# Altium footprint library Footprint.PcbLib: 14 footprints
Each footprint in its own frame and in the unit in brackets; x right, y up, seen from the top. Pads: shape width x height; smd on the part's side, far side on the other; paste and mask are expansions set on the pad; w line width, h text height; cw(c..) or ccw(c..) is an arc to the next point about the centre after c.
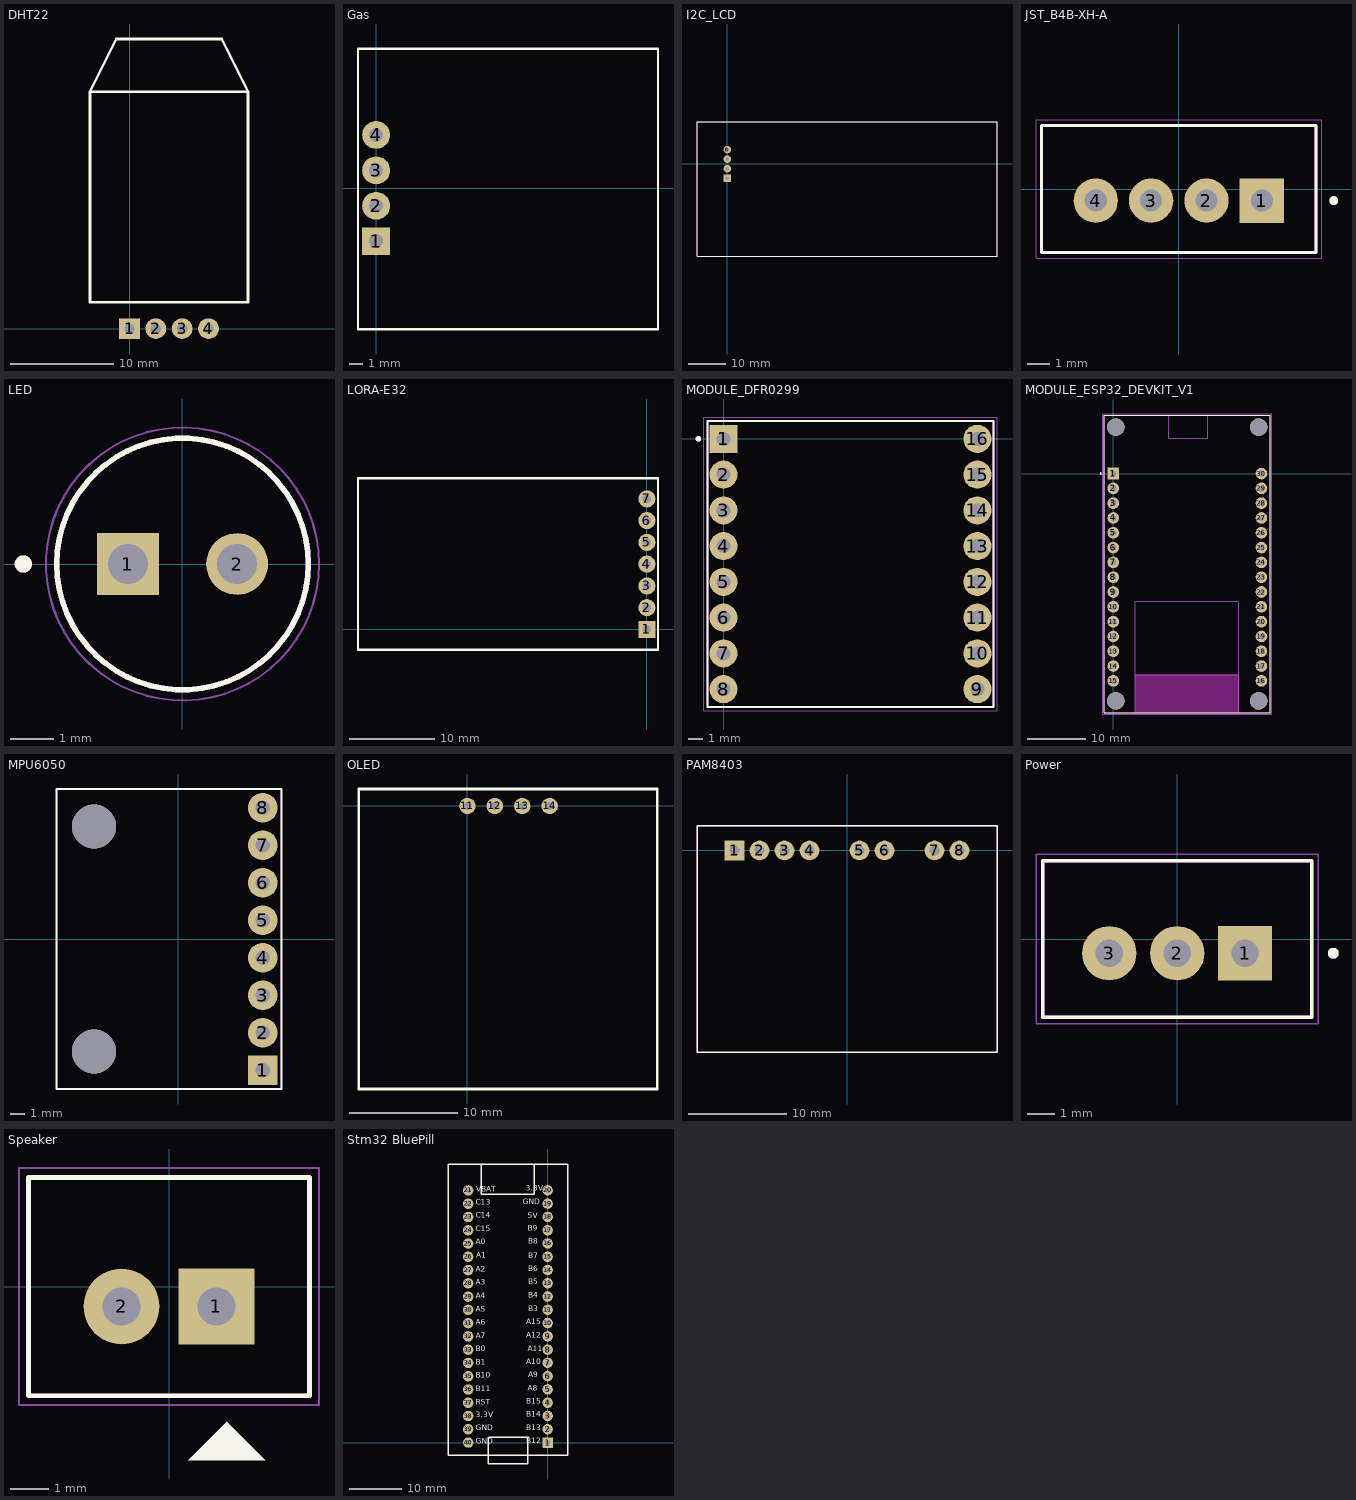
[diagram p0: the footprints below, top view; thin cyan lines are the x and y axes]

## DHT22 [mm]
pads (4):
  rect 2x2 hole 1: 1(0,0)
  round 2 hole 1: 2(2.54,0) 3(5.08,0) 4(7.62,0)
Top Overlay:
  lines w0.254: -3.81,22.86 -3.81,2.54 3.81,2.54 11.43,2.54 11.43,22.86 ; -3.81,22.86 11.43,22.86 ; -3.81,22.86 -1.27,27.94 8.89,27.94 11.43,22.86
3D body "step_temp.STEP": height 7.7, standoff -4.5, extent -3.74,-0.25 11.36,27.64

## Gas [mm]
pads (4):
  rect 2x2 hole 1: 1(0,-3.81)
  round 2 hole 1: 2(0,-1.27) 3(0,1.27) 4(0,3.81)
Top Overlay:
  lines w0.15: -1.301,-10.118 -1.301,9.982 20.199,9.982 20.199,-10.118 -1.301,-10.118
Top Assembly:
  lines w0.1: -1.301,-10.118 -1.301,9.982 20.199,9.982 20.199,-10.118 -1.301,-10.118
3D body "User Library-MQ2 Gas Sensor.STEP": height 32.26, standoff -3.99, extent -1.301,-10.118 20.199,9.982

## I2C_LCD [mm]
pads (4):
  round 2 hole 1: 8(0,3.81) 15(0,-1.27) 16(0,1.27)
  rect 2x2 hole 1: 14(0,-3.81)
Top Overlay:
  lines w0.15: -8.088,-24.693 71.912,-24.693 71.912,11.307 -8.088,11.307 -8.088,-24.693
Top Assembly:
  lines w0.1: -8.088,-24.693 71.912,-24.693 71.912,11.307 -8.088,11.307 -8.088,-24.693
3D body "LCD AP214.STEP": height 22.01, standoff -0.61, extent -8.088,-24.693 71.912,11.307

## JST_B4B-XH-A [mm]
height 7
pads (4):
  rect 2x2 hole 1: 1(3.75,-0.525)
  round 2 hole 1: 2(1.25,-0.525) 3(-1.25,-0.525) 4(-3.75,-0.525)
Top Overlay:
  circle w0.2: c7,-0.525 r0.1
  lines w0.127: -6.2,-2.875 6.2,-2.875 6.2,2.875 -6.2,2.875 -6.2,-2.875
Top 3D Body:
  circle w0.2: c7,-0.525 r0.1
  lines w0.127: -6.2,-2.875 6.2,-2.875 6.2,2.875 -6.2,2.875 -6.2,-2.875
Top Assembly:
  lines w0.05: -6.45,-3.125 6.45,-3.125 6.45,3.125 -6.45,3.125 -6.45,-3.125
3D body "step_temp.STEP": height 7, standoff -3.4, extent -6.2,-2.875 6.2,2.875

## LED [mm]
pads (2):
  rect 1.438x1.438 / inner round 1.438 / far side rect 1.438x1.438 hole 0.93: 1(-1.27,0)
  round 1.438 hole 0.93: 2(1.27,0)
Top Overlay:
  circle w0.127: c0,0 r2.923
  circle w0.2: c-3.7,0 r0.1
Top 3D Body:
  circle w0.127: c0,0 r2.923
  circle w0.2: c-3.7,0 r0.1
Top Assembly:
  circle w0.05: c0,0 r3.173
3D body "step_temp.STEP": height 12.7, standoff -21.1, extent -2.9,-2.897 2.5,2.897

## LORA-E32 [mm] "Design By @Alixahedi"
pads (7):
  rect 2x2 hole 1: 1(0,0)
  round 2 hole 1: 2(0,2.54) 3(0,5.08) 4(0,7.62) 5(0,10.16) 6(0,12.7) 7(0,15.24)
Top Overlay:
  lines w0.254: -33.707,-2.362 1.293,-2.362 1.293,17.638 -33.707,17.638 -33.707,-2.362
3D body "E32-433T20DT.stp": height 8.1, standoff -5.52, extent -46.976,-2.88 1.524,18.12

## MODULE_DFR0299 [mm]
pads (16):
  rect 2x2 hole 1: 1(0,0)
  round 2 hole 1: 2(0,-2.54) 3(0,-5.08) 4(0,-7.62) 5(0,-10.16) 6(0,-12.7) 7(0,-15.24) 8(0,-17.78) 9(18.034,-17.78) 10(18.034,-15.24) 11(18.034,-12.7) 12(18.034,-10.16) 13(18.034,-7.62) 14(18.034,-5.08) 15(18.034,-2.54) 16(18.034,0)
Top Overlay:
  circle w0.2: c-1.783,0 r0.1
  lines w0.127: -1.143,-19.05 19.177,-19.05 19.177,1.27 -1.143,1.27 -1.143,-19.05
Top 3D Body:
  circle w0.2: c-1.783,0 r0.1
  lines w0.127: -1.143,-19.05 -1.143,1.27 19.177,1.27 19.177,-19.05 -1.143,-19.05
Top Assembly:
  lines w0.05: -1.393,-19.3 -1.393,1.52 19.427,1.52 19.427,-19.3 -1.393,-19.3
3D body "step_temp.STEP": height 6.25, standoff -5.5, extent -1.143,-19.05 19.177,1.27

## MODULE_ESP32_DEVKIT_V1 [mm]
height 6.8
pads (34):
  rect 2x2 / inner round 2 / far side rect 2x2 hole 1.02: 1(0,0)
  round 2 hole 1.02: 2(0,-2.54) 3(0,-5.08) 4(0,-7.62) 5(0,-10.16) 6(0,-12.7) 7(0,-15.24) 8(0,-17.78) 9(0,-20.32) 10(0,-22.86) 11(0,-25.4) 12(0,-27.94) 13(0,-30.48) 14(0,-33.02) 15(0,-35.56) 16(25.4,-35.56) 17(25.4,-33.02) 18(25.4,-30.48) 19(25.4,-27.94) 20(25.4,-25.4) 21(25.4,-22.86) 22(25.4,-20.32) 23(25.4,-17.78) 24(25.4,-15.24) 25(25.4,-12.7) 26(25.4,-10.16) 27(25.4,-7.62) 28(25.4,-5.08) 29(25.4,-2.54) 30(25.4,0)
  round 3 hole 3 unplated: ""(0.42,-38.99) ""(0.42,7.96) ""(24.93,-38.99) ""(24.93,7.96)
Top Overlay:
  circle w0.2: c-2.15,0 r0.1
  lines w0.127: -1.58,-40.99 3.79,-40.99 21.48,-40.99 26.93,-40.99 ; -1.58,-40.99 -1.58,9.96 ; -1.58,-40.99 -1.58,9.96 ; -1.58,-40.99 26.93,-40.99 ; -1.58,9.96 9.489,9.96 16.2,9.96 26.93,9.96 ; -1.58,9.96 26.93,9.96 ; 26.93,-40.99 26.93,9.96 ; 26.93,-40.99 26.93,9.96
Keep-Out Layer:
  region: 21.48,-40.99 3.79,-40.99 3.79,-34.5 21.48,-34.5
  region: 21.48,-40.99 3.79,-40.99 3.79,-34.5 21.48,-34.5
Top 3D Body:
  circle w0.2: c-2.15,0 r0.1
  lines w0.127: 3.79,-40.99 3.79,-34.5 ; 3.79,-40.99 21.48,-40.99 ; 3.79,-40.99 -1.58,-40.99 -1.58,9.96 9.489,9.96 ; 3.79,-34.5 21.48,-34.5 ; 3.79,-34.5 3.79,-21.87 21.48,-21.87 21.48,-34.5 ; 9.489,9.96 9.489,6.07 16.2,6.07 16.2,9.96 ; 9.489,9.96 16.2,9.96 ; 16.2,9.96 26.93,9.96 26.93,-40.99 21.48,-40.99 ; 21.48,-40.99 21.48,-34.5
Top Assembly:
  lines w0.05: -1.83,-41.24 27.18,-41.24 27.18,10.21 -1.83,10.21 -1.83,-41.24
3D body "step_temp.STEP": height 7.05, standoff -6, extent -1.4,-41.618 26.8,10.832

## MPU6050 [mm]
pads (10):
  rect 2x2 hole 1: 1(5.715,-8.89)
  round 2 hole 1: 2(5.715,-6.35) 3(5.715,-3.81) 4(5.715,-1.27) 5(5.715,1.27) 6(5.715,3.81) 7(5.715,6.35) 8(5.715,8.89)
  round 2.997 hole 2.997: ""(-5.715,-7.62) ""(-5.715,7.62)
Top Overlay:
  lines w0.15: -8.255,-10.16 -8.255,10.16 6.985,10.16 6.985,-10.16 -8.255,-10.16
Top Assembly:
  lines w0.1: -8.255,-10.16 -8.255,10.16 6.985,10.16 6.985,-10.16 -8.255,-10.16
3D body "User Library-GY-521-1.STEP": height 5.58, standoff -6.24, extent -8.26,-10.16 6.985,10.16

## OLED [mil]
pads (4):
  round 60 hole 30: 11(0,0) 12(100,0) 13(200,0) 14(300,0)
Top Overlay:
  lines w10: -396.8,-1032.5 693,-1032.5 693,62 -396.8,62 -396.8,-1032.5
3D body "OLED-128x64-0.96 (SMALL SIZE).SLDPRT": height 106.3, standoff -314.96, extent -342.12,-1015.74 642.13,55.12

## PAM8403 [mm]
pads (8):
  rect 2x2 hole 1: 1(-11.43,0)
  round 2 hole 1: 2(-8.89,0) 3(-6.35,0) 4(-3.81,0) 5(1.27,0) 6(3.81,0) 7(8.89,0) 8(11.43,0)
Top Overlay:
  lines w0.15: -15.24,-20.5 -15.24,2.5 15.24,2.5 15.24,-20.5 -15.24,-20.5
Top Assembly:
  lines w0.1: -15.24,-20.5 -15.24,2.5 15.24,2.5 15.24,-20.5 -15.24,-20.5

## Power [mm]
height 7
pads (3):
  rect 2x2 hole 1: 1(2.5,-0.525)
  round 2 hole 1: 2(0,-0.525) 3(-2.5,-0.525)
Top Overlay:
  circle w0.2: c5.75,-0.525 r0.1
  lines w0.127: -4.95,-2.875 -4.95,2.875 4.95,2.875 4.95,-2.875 -4.95,-2.875
Top 3D Body:
  circle w0.2: c5.75,-0.525 r0.1
  lines w0.127: -4.95,-2.875 -4.95,2.875 4.95,2.875 4.95,-2.875 -4.95,-2.875
Top Assembly:
  lines w0.05: -5.2,-3.125 -5.2,3.125 5.2,3.125 5.2,-3.125 -5.2,-3.125
3D body "step_temp.STEP": height 7, standoff -3.4, extent -4.95,-2.875 4.95,2.875

## Speaker [mm]
height 7
pads (2):
  rect 2x2 hole 1: 1(1.25,-0.525)
  round 2 hole 1: 2(-1.25,-0.525)
Top Overlay:
  region: 1.524,-3.556 0.508,-4.572 2.54,-4.572
  lines w0.127: -3.7,-2.875 3.7,-2.875 3.7,2.875 -3.7,2.875 -3.7,-2.875
Top 3D Body:
  lines w0.127: -3.7,-2.875 3.7,-2.875 3.7,2.875 -3.7,2.875 -3.7,-2.875
Top Assembly:
  lines w0.05: -3.95,-3.125 -3.95,3.125 3.95,3.125 3.95,-3.125 -3.95,-3.125
3D body "step_temp.STEP": height 7, standoff -3.4, extent -3.7,-2.875 3.7,2.875

## Stm32 BluePill [mm]
pads (40):
  rect 2x2 hole 1: 1(0,0)
  round 2 hole 1: 2(0,2.565) 3(0,5.105) 4(0,7.645) 5(0,10.185) 6(0,12.725) 7(0,15.265) 8(0,17.805) 9(0,20.345) 10(0,22.885) 11(0,25.425) 12(0,27.965) 13(0,30.505) 14(0,33.045) 15(0,35.585) 16(0,38.125) 17(0,40.665) 18(0,43.205) 19(0,45.745) 20(0,48.285) 21(-15.215,48.275) 22(-15.215,45.735) 23(-15.215,43.195) 24(-15.215,40.655) 25(-15.215,38.115) 26(-15.215,35.575) 27(-15.215,33.035) 28(-15.215,30.495) 29(-15.215,27.955) 30(-15.215,25.415) 31(-15.215,22.875) 32(-15.215,20.335) 33(-15.215,17.795) 34(-15.215,15.255) 35(-15.215,12.715) 36(-15.215,10.175) 37(-15.215,7.635) 38(-15.215,5.095) 39(-15.215,2.555) 40(-15.215,0.015)
Top Overlay:
  lines w0.254: -18.999,-2.388 3.865,-2.435 ; -18.986,-2.4 -19.05,53.34 3.81,53.34 3.861,-2.4 ; -11.405,0.991 -11.405,-4.089 -3.785,-4.089 -3.785,0.991 ; -11.384,0.991 -11.384,-4.089 -6.05,-4.089 ; -11.278,0.991 -3.658,0.991 ; -11.257,0.991 -5.923,0.991 ; -2.54,53.276 -2.54,47.561 -12.7,47.561 ; -12.7,47.561 -12.7,53.276 -12.7,47.561
  text "B12" at -4.079,-0.546 h1.78
  text "GND" at -13.741,-0.603 h1.78
  text "B13" at -4.089,1.963 h1.78
  text "GND" at -13.741,1.963 h1.78
  text "A1" at -13.67,34.989 h1.78
  text "A0" at -13.741,37.548 h1.78
  text "C14" at -13.741,42.679 h1.78
  text "C13" at -13.741,45.168 h1.78
  text "C15" at -13.741,40.114 h1.78
  text "B6" at -3.678,32.468 h1.78
  text "B4" at -3.741,27.318 h1.78
  text "B7" at -3.708,34.938 h1.78
  text "B14" at -4.11,4.534 h1.78
  text "B5" at -3.708,29.903 h1.78
  text "VBAT" at -13.669,47.688 h1.78
  text "A10" at -4.143,14.637 h1.78
  text "A12" at -4.143,19.723 h1.78
  text "A15" at -4.143,22.308 h1.78
  text "A9" at -3.741,12.148 h1.78
  text "B3" at -3.708,24.797 h1.78
  text "A11" at -3.856,17.158 h1.78
  text "A8" at -3.772,9.583 h1.78
  text "B15" at -4.079,7.017 h1.78
  text "3.3V" at -13.741,4.452 h1.78
  text "B1" at -13.741,14.516 h1.78
  text "B0" at -13.741,17.076 h1.78
  text "A7" at -13.741,19.621 h1.78
  text "A6" at -13.741,22.207 h1.78
  text "B11" at -13.741,9.461 h1.78
  text "B10" at -13.741,12.047 h1.78
  text "RST" at -13.741,6.916 h1.78
  text "A4" at -13.741,27.216 h1.78
  text "A3" at -13.741,29.801 h1.78
  text "A2" at -13.741,32.347 h1.78
  text "A5" at -13.741,24.696 h1.78
  text "GND" at -4.78,45.295 h1.78
  text "3.3V" at -4.216,47.81 h1.78
  text "B8" at -3.708,37.65 h1.78
  text "B9" at -3.835,40.19 h1.78
  text "5V" at -3.835,42.603 h1.78
3D body "STM32.step": height 12.31, standoff -5.96, extent -19.004,-3.365 3.856,54.195